# Altium footprint library Connector.PcbLib: 536 footprints (part 1 of 34)
Each footprint in its own frame and in the unit in brackets; x right, y up, seen from the top. Pads: shape width x height; smd on the part's side, far side on the other; paste and mask are expansions set on the pad; w line width, h text height; cw(c..) or ccw(c..) is an arc to the next point about the centre after c.
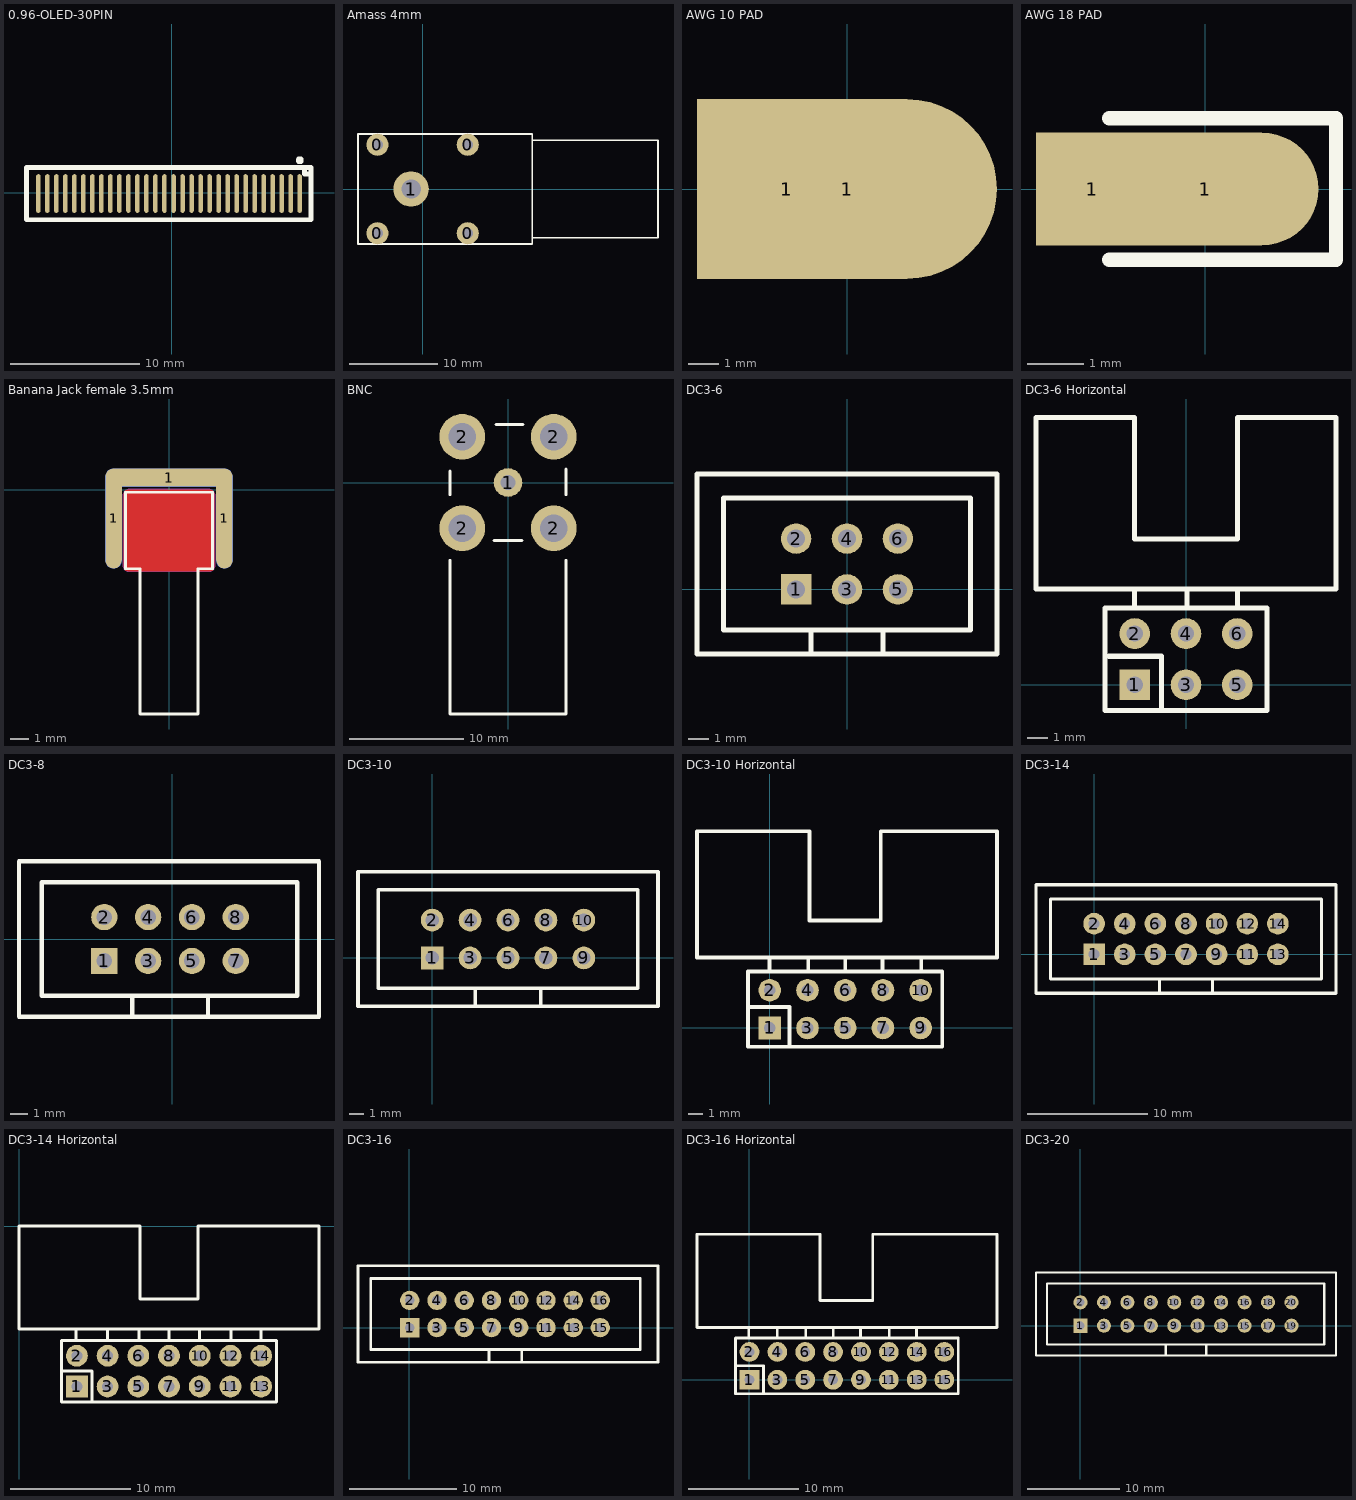
[diagram p0: the footprints below, top view; thin cyan lines are the x and y axes]

## 0.96-OLED-30PIN [mm]
pads (30):
  oval 0.35x3 smd: 1(9.946,-0.045) 2(9.246,-0.045) 3(8.546,-0.045) 4(7.846,-0.045) 5(7.146,-0.045) 6(6.446,-0.045) 7(5.746,-0.045) 8(5.046,-0.045) 9(4.346,-0.045) 10(3.646,-0.045) 11(2.946,-0.045) 12(2.246,-0.045) 13(1.546,-0.045) 14(0.846,-0.045) 15(0.146,-0.045) 16(-0.554,-0.045) 17(-1.254,-0.045) 18(-1.954,-0.045) 19(-2.654,-0.045) 20(-3.354,-0.045) 21(-4.054,-0.045) 22(-4.754,-0.045) 23(-5.454,-0.045) 24(-6.154,-0.045) 25(-6.854,-0.045) 26(-7.554,-0.045) 27(-8.254,-0.045) 28(-8.954,-0.045) 29(-9.654,-0.045) 30(-10.354,-0.045)
Top Overlay:
  circle w0.3: c9.957,2.54 r0.152
  lines w0.381: 10.327,1.987 10.327,1.479 10.835,1.479 ; -11.263,-2.077 10.835,-2.077 10.835,1.987 -11.263,1.987 -11.263,-2.077

## Amass 4mm [mm]
pads (5):
  round 2.5 hole 1.2: 0(-5.1,-5) 0(-5.1,5) 0(5.1,-5) 0(5.1,5)
  round 4 hole 2.2: 1(-1.3,0)
Top Overlay:
  lines w0.203: 12.4,-5.5 26.6,-5.5 26.6,5.5 12.4,5.5 ; -7.3,-6.2 -7.3,6.2 12.4,6.2 12.4,-6.2 -7.3,-6.2

## AWG 10 PAD [mm]
pads (2):
  rect 6x6 smd: 1(-2,0)
  oval 10x6 smd: 1(0,0)

## AWG 18 PAD [mm]
pads (2):
  rect 2x2 smd: 1(-2,0)
  oval 4x2 smd: 1(0,0)
Top Overlay:
  lines w0.254: -1.702,-1.25 2.311,-1.25 2.311,1.25 -1.702,1.25

## Banana Jack female 3.5mm [mm]
pads (6):
  oval 0.9x5.5 smd: 1(-3.05,-1.59) 1(3.05,-1.59)
  oval 0.9x5.5 smd far side: 1(-3.05,-1.59) 1(3.05,-1.59)
  oval 7x1 smd: 1(0,0.66)
  oval 7x1 smd far side: 1(0,0.66)
Top Layer:
  pour cut-out: -2.2,-4.5 2.2,-4.5 2.26,-4.5 2.37,-4.454 2.454,-4.37 2.5,-4.26 2.5,-4.2 2.5,-0.3 2.5,-0.24 2.454,-0.13 2.37,-0.046 2.26,0 2.2,0 -2.2,0 -2.26,0 -2.37,-0.046 -2.454,-0.13 -2.5,-0.24 -2.5,-0.3 -2.5,-4.2 -2.5,-4.26 -2.454,-4.37 -2.37,-4.454 -2.26,-4.5
Top Overlay:
  lines w0.152: -2.4,-4.352 -1.6,-4.352 -1.6,-12.352 1.6,-12.352 1.6,-4.352 2.4,-4.352 2.4,-0.152 -2.4,-0.152 -2.4,-4.352
Mechanical 1:
  lines w0.1: -2.5,-4.2 ccw(c-2.2,-4.2) -2.2,-4.5 2.2,-4.5 ccw(c2.2,-4.2) 2.5,-4.2 2.5,-0.3 ccw(c2.2,-0.3) 2.2,0 -2.2,0 ccw(c-2.2,-0.3) -2.5,-0.3 -2.5,-4.2
3D body: height 3.4, standoff -1.4, extent -2.4,-4.352 2.4,-0.152
3D body: height 2.6, standoff -0.6, extent -1.6,-12.352 1.6,-0.152

## BNC [mm]
pads (5):
  round 2.5 hole 1.3: 1(0,0)
  round 4 hole 2.4: 2(-4,-4) 2(-4,4) 2(4,-4) 2(4,4)
Top Overlay:
  lines w0.254: -5.08,-6.807 -5.08,-20.269 5.08,-20.269 5.08,-6.807 ; -5.08,-1.067 -5.08,1.016 ; -1.219,-5.08 1.219,-5.08 ; -1.067,5.08 1.321,5.08 ; 5.08,-1.067 5.08,1.168
3D body "BNC_K.STEP": height 14.5, standoff -4, extent -5.992,-16.904 5.994,6.083

## DC3-6 [mil] "6脚简易牛角座"
pads (6):
  rect 60x60 hole 35.43: 1(-100,0)
  round 60 hole 35.43: 2(-100,100) 3(0,0) 4(0,100) 5(100,0) 6(100,100)
Top Overlay:
  lines w10: -71,-127.17 -71,-79.92 ; 71,-127.17 71,-79.92 ; -294.76,-127.17 294.76,-127.17 294.76,227.16 -294.76,227.16 -294.76,-127.17 ; -242.52,-79.92 -242.52,179.92 242.52,179.92 242.52,-79.92 -242.52,-79.92
3D body "612006235121.stp": height 358.27, standoff -114.17, extent -300.79,-123.3 300.79,233

## DC3-6 Horizontal [mil] "弯头6脚简易牛角座"
pads (6):
  rect 60x60 hole 31.5: 1(-100,0)
  round 60 hole 31.5: 2(-100,100) 3(0,0) 4(0,100) 5(100,0) 6(100,100)
Top Overlay:
  lines w9.84: -100.39,150 -100.39,187.01 ; 1.97,150 1.97,187.01 ; 100.39,150 100.39,187.01 ; -292.8,187.01 292.8,187.01 292.8,521.65 100.39,521.65 100.39,284.65 -100.39,284.65 -100.39,521.65 -292.8,521.65 -292.8,187.01
  lines w10: -150,55.87 -47.8,55.87 -47.8,-49.13 ; -157.8,-50 157.8,-50 157.8,150 -157.8,150 -157.8,-50
3D body "612006235221.stp": height 358.27, standoff -122.05, extent -299.79,-13 301.79,509.05

## DC3-8 [mil] "8脚简易牛角座"
pads (8):
  rect 60x60 hole 35.43: 1(-155,-50)
  round 60 hole 35.43: 2(-155,50) 3(-55,-50) 4(-55,50) 5(45,-50) 6(45,50) 7(145,-50) 8(145,50)
Top Overlay:
  lines w10: -91.61,-177.16 -91.61,-129.92 ; 81.61,-177.16 81.61,-129.92 ; -349.76,-177.16 -349.76,177.16 335,177.16 335,-177.16 -349.76,-177.16 ; -297.52,-129.92 285,-129.92 285,129.92 -297.52,129.92 -297.52,-129.92
3D body "612008235121.stp": height 358.27, standoff -114.17, extent -356.78,-173.22 344.79,183.08

## DC3-10 [mil] "10脚简易牛角座"
pads (10):
  rect 60x60 hole 35.43: 1(0,0)
  round 60 hole 35.43: 2(0,100) 3(100,0) 4(100,100) 5(200,0) 6(200,100) 7(300,0) 8(300,100) 9(400,0) 10(400,100)
Top Overlay:
  lines w10: 113.39,-127.17 113.39,-79.92 ; 286.61,-127.17 286.61,-79.92 ; -195.76,-127.17 -195.76,227.16 595.76,227.16 595.76,-127.17 -195.76,-127.17 ; -142.52,-79.92 -142.52,179.92 542.52,179.92 542.52,-79.92 -142.52,-79.92
3D body "612010235121.stp": height 358.27, standoff -114.17, extent -199.78,-123.22 601.79,233.08

## DC3-10 Horizontal [mil] "弯头10脚简易牛角座"
pads (10):
  rect 60x60 hole 31.5: 1(0,0)
  round 60 hole 31.5: 2(0,100) 3(100,0) 4(100,100) 5(200,0) 6(200,100) 7(300,0) 8(300,100) 9(400,0) 10(400,100)
Top Overlay:
  lines w9.84: -0.39,150 -0.39,187.01 ; 101.97,150 101.97,187.01 ; 200.39,150 200.39,187.01 ; 298.82,150 298.82,187.01 ; 401.18,150 401.18,187.01 ; -192.79,187.01 -192.79,521.65 105.51,521.65 105.51,284.65 294.49,284.65 294.49,521.65 602.21,521.65 602.21,187.01 -192.79,187.01
  lines w10: -50,55.87 52.2,55.87 52.2,-49.13 ; -57.8,-50 -57.8,150 457.2,150 457.2,-50 -57.8,-50
3D body "612010235221.stp": height 358.27, standoff -122.05, extent -200.79,-14 600.79,508.05

## DC3-14 [mm] "14脚简易牛角座"
height 1.6
pads (14):
  rect 1.8x1.8 hole 0.9: 1(-0.002,0)
  round 1.8 hole 0.9: 2(-0.002,2.54) 3(2.538,0) 4(2.538,2.54) 5(5.078,0) 6(5.078,2.54) 7(7.618,0) 8(7.618,2.54) 9(10.158,0) 10(10.158,2.54) 11(12.698,0) 12(12.698,2.54) 13(15.238,0) 14(15.238,2.54)
Top Overlay:
  lines w0.254: 5.418,-3.23 5.418,-2.03 ; 9.818,-3.23 9.818,-2.03 ; -4.822,-3.23 20.058,-3.23 20.058,5.77 -4.822,5.77 -4.822,-3.23 ; -3.622,-2.03 18.858,-2.03 18.858,4.57 -3.622,4.57 -3.622,-2.03
3D body "612014235121.stp": height 9.1, standoff -2.9, extent -5.125,-3.155 20.315,5.895

## DC3-14 Horizontal [mm] "弯头14脚简易牛角座"
pads (14):
  rect 1.8x1.8 hole 0.9: 1(4.774,-13.233)
  round 1.8 hole 0.9: 2(4.774,-10.693) 3(7.314,-13.233) 4(7.314,-10.693) 5(9.854,-13.233) 6(9.854,-10.693) 7(12.394,-13.233) 8(12.394,-10.693) 9(14.934,-13.233) 10(14.934,-10.693) 11(17.474,-13.233) 12(17.474,-10.693) 13(20.014,-13.233) 14(20.014,-10.693)
Top Overlay:
  lines w0.25: 4.7,-9.42 4.7,-8.48 ; 7.3,-9.42 7.3,-8.48 ; 9.9,-9.42 9.9,-8.48 ; 12.4,-9.42 12.4,-8.48 ; 14.9,-9.42 14.9,-8.48 ; 17.5,-9.42 17.5,-8.48 ; 20,-9.42 20,-8.48 ; -0.01,-8.48 24.79,-8.48 24.79,0.02 14.79,0.02 14.79,-6 9.99,-6 9.99,0.02 -0.01,0.02 -0.01,-8.48
  lines w0.254: 3.5,-11.96 6.04,-11.96 6.04,-14.5 ; 3.5,-14.5 21.28,-14.5 21.28,-9.42 3.5,-9.42 3.5,-14.5
3D body "612014235221.stp": height 9.1, standoff -3.1, extent -0.325,-13.538 25.115,-0.278

## DC3-16 [mm] "16脚简易牛角座"
pads (16):
  rect 1.8x1.8 hole 0.9: 1(0.025,0)
  round 1.8 hole 0.9: 2(0.025,2.54) 3(2.565,0) 4(2.565,2.54) 5(5.105,0) 6(5.105,2.54) 7(7.645,0) 8(7.645,2.54) 9(10.185,0) 10(10.185,2.54) 11(12.725,0) 12(12.725,2.54) 13(15.265,0) 14(15.265,2.54) 15(17.78,0) 16(17.78,2.54)
Top Overlay:
  lines w0.254: 7.418,-3.23 7.418,-2.083 ; 10.466,-3.23 10.466,-2.083 ; -4.795,-3.23 23.166,-3.23 23.166,5.77 -4.795,5.77 -4.795,-3.23 ; -3.595,-2.03 21.515,-2.03 21.515,4.57 -3.595,4.57 -3.595,-2.03
3D body "612016235121.stp": height 4.4, standoff -7.6, extent -5.049,-3.104 22.931,5.946

## DC3-16 Horizontal [mm] "弯头16脚简易牛角座"
pads (16):
  rect 1.8x1.8 hole 0.9: 1(0,0)
  round 1.8 hole 0.9: 2(0,2.54) 3(2.54,0) 4(2.54,2.54) 5(5.08,0) 6(5.08,2.54) 7(7.62,0) 8(7.62,2.54) 9(10.16,0) 10(10.16,2.54) 11(12.7,0) 12(12.7,2.54) 13(15.24,0) 14(15.24,2.54) 15(17.755,0) 16(17.755,2.54)
Top Overlay:
  lines w0.25: -0.074,3.813 -0.074,4.753 ; 2.526,3.813 2.526,4.753 ; 5.126,3.813 5.126,4.753 ; 7.626,3.813 7.626,4.753 ; 10.126,3.813 10.126,4.753 ; 12.726,3.813 12.726,4.753 ; 15.226,3.813 15.226,4.753 ; -4.784,4.753 -4.784,13.253 6.428,13.253 6.428,7.233 11.228,7.233 11.228,13.253 22.557,13.253 22.557,4.753 -4.784,4.753
  lines w0.254: -1.274,1.273 1.266,1.273 1.266,-1.267 ; -1.274,-1.267 -1.274,3.813 19.026,3.813 19.026,-1.267 -1.274,-1.267
3D body "612016235221.stp": height 9.1, standoff -3.1, extent -5.125,-0.305 22.855,12.955

## DC3-20 [mil] "20脚简易牛角座"
pads (20):
  rect 60x60 hole 35.43: 1(0,0)
  round 60 hole 35.43: 2(0,100) 3(100,0) 4(100,100) 5(200,0) 6(200,100) 7(300,0) 8(300,100) 9(400,0) 10(400,100) 11(500,0) 12(500,100) 13(600,0) 14(600,100) 15(700,0) 16(700,100) 17(800,0) 18(800,100) 19(900,0) 20(900,100)
Top Overlay:
  lines w10: 363.39,-127.17 363.39,-79.92 ; 536.61,-127.17 536.61,-79.92 ; -189.76,-127.17 1090,-127.17 1090,227.16 -189.76,227.16 -189.76,-127.17 ; -142.52,-79.92 1040,-79.92 1040,179.92 -142.52,179.92 -142.52,-79.92
3D body "612020235121.stp": height 358.27, standoff -114.17, extent -199.78,-123.22 1101.79,233.08